# Altium footprint library PassiveComponents.PcbLib: 48 footprints (part 3 of 3)
Each footprint in its own frame and in the unit in brackets; x right, y up, seen from the top. Pads: shape width x height; smd on the part's side, far side on the other; paste and mask are expansions set on the pad; w line width, h text height; cw(c..) or ccw(c..) is an arc to the next point about the centre after c.
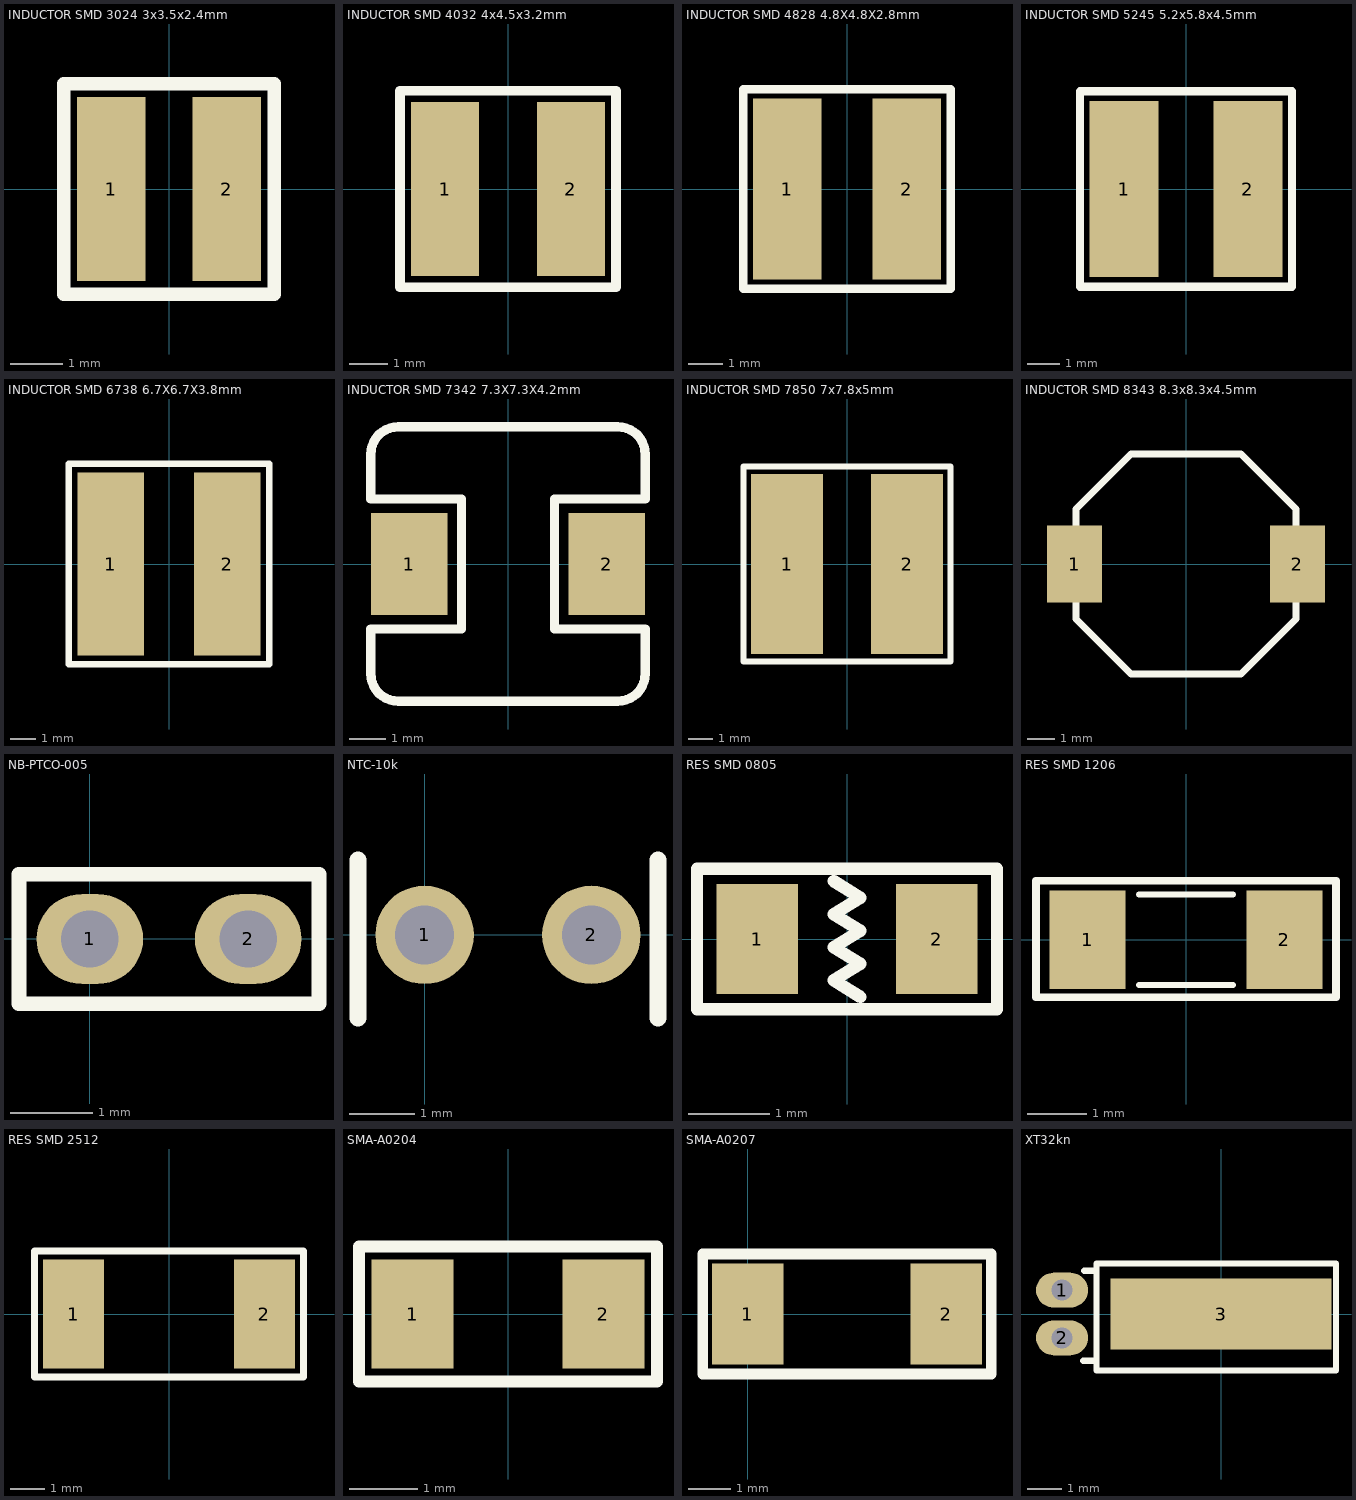
[diagram p2: the footprints below, top view; thin cyan lines are the x and y axes]

## INDUCTOR SMD 3024 3x3.5x2.4mm [mm] "Inductor CD43 Body 3x3.5x2.4mm, Pad 3.5x1.3mm"
height 2.4
pads (2):
  rect 1.3x3.5 smd: 1(-1.1,0) 2(1.1,0)
Top Overlay:
  lines w0.254: -2,-2 2,-2 2,2 -2,2 -2,-2
3D body "User Library-SDR0302.STEP": height 3, standoff 0, extent -1.5,-1.488 1.5,1.488

## INDUCTOR SMD 4032 4x4.5x3.2mm [mm] "Inductor 4032 Body 4x4.5x3.2mm, Pad 4.5X1.75mm"
height 3.2
pads (2):
  rect 1.75x4.5 smd: 1(-1.625,0) 2(1.625,0)
Top Overlay:
  lines w0.254: -2.794,-2.54 -2.794,2.54 2.794,2.54 2.794,-2.54 -2.794,-2.54
3D body "User Library-4532-1.STEP": height 3.18, standoff -0.07, extent -2.244,-2.057 2.245,1.943

## INDUCTOR SMD 4828 4.8X4.8X2.8mm [mm] "Inductor 4D28 Body 4.8X4.8X2.8mm, Pad 5.3x2mm"
height 2.8
pads (2):
  rect 2x5.3 smd: 1(-1.75,0) 2(1.75,0)
Top Overlay:
  lines w0.254: -3.048,-2.921 -3.048,2.921 3.048,2.921 3.048,-2.921 -3.048,-2.921
3D body "Coilcraft-MSS6132-DEFAULT.STEP": height 3, standoff -0.2, extent -2.994,-2.982 3,2.982

## INDUCTOR SMD 5245 5.2x5.8x4.5mm [mm] "Inductor 5245 Body 5.2x5.8x4.5mm, Pad 5.5x2.15mm"
height 4.5
pads (2):
  rect 2.15x5.5 smd: 1(-1.925,0) 2(1.925,0)
Top Overlay:
  lines w0.254: -3.302,-3.048 -3.302,3.048 3.302,3.048 3.302,-3.048 -3.302,-3.048
3D body "User Library-5845.STEP": height 4.5, standoff -0.05, extent -2.893,-2.592 2.893,2.592

## INDUCTOR SMD 6738 6.7X6.7X3.8mm [mm] "Inductor 6D38 Body 6.7X6.7X3.8mmmm, Pad 7.3x2.65mm"
height 3.8
pads (2):
  rect 2.65x7.3 smd: 1(-2.325,0) 2(2.325,0)
Top Overlay:
  lines w0.254: -4,-4 4,-4 4,4 -4,4 -4,-4
3D body "Coilcraft-MSS7341T.STEP": height 4.1, standoff 0, extent -3.78,-3.751 3.78,3.78

## INDUCTOR SMD 7342 7.3X7.3X4.2mm [mm] "Inductor 7342 Body 7.3x7.3X4.2mm, Pad 2.8x2.1mm"
height 4.2
pads (2):
  rect 2.1x2.8 smd: 1(-2.7,0) 2(2.7,0)
Top Overlay:
  lines w0.254: -3.75,-3 ccw(c-3,-3) -3,-3.75 3,-3.75 ccw(c3,-3) 3.75,-3 3.75,-1.778 1.27,-1.778 1.27,1.778 3.75,1.778 3.75,3 ccw(c3,3) 3,3.75 -3,3.75 ccw(c-3,3) -3.75,3 -3.75,1.778 -1.27,1.778 -1.27,-1.778 -3.75,-1.778 -3.75,-3
3D body "User Library-WE-DD-M.STEP": height 4.8, standoff 0, extent -3.65,-3.65 3.65,3.65

## INDUCTOR SMD 7850 7x7.8x5mm [mm] "Inductor 7850 Body 7x7.8x5mm, Pad 5.5x2.15mm"
height 4.5
pads (2):
  rect 3x7.5 smd: 1(-2.5,0) 2(2.5,0)
Top Overlay:
  lines w0.254: -4.318,-4.064 4.318,-4.064 4.318,4.064 -4.318,4.064 -4.318,-4.064
3D body "User Library-7850-1.STEP": height 5, standoff -0.05, extent -3.896,-3.486 3.896,3.514

## INDUCTOR SMD 8343 8.3x8.3x4.5mm [mm] "Inductor 8D43 Body 8.3x8.3x4.5mm, Pad 2x2.8mm"
height 4.5
pads (2):
  rect 2x2.8 smd: 1(-4.05,0) 2(4.05,0)
Top Overlay:
  lines w0.254: -4,-2 -4,2 -2,4 2,4 4,2 4,-2 2,-4 -2,-4 -4,-2

## NB-PTCO-005 [mm] "PT100"
pads (2):
  oval 1.3x1.1 hole 0.7: 1(0,0) 2(1.93,0)
Top Overlay:
  lines w0.178: -0.864,-0.787 2.794,-0.787 2.794,0.787 -0.864,0.787 -0.864,-0.787
3D body "c-nb-ptco-005-1-3d.stp": height 4.3, standoff -8, extent -0.035,-0.457 1.965,0.543

## NTC-10k [mm]
pads (2):
  round 1.5 hole 0.9: 1(0,0) 2(2.54,0)
Top Overlay:
  lines w0.254: -1.016,-1.27 -1.016,1.143 ; 3.556,-1.27 3.556,1.143
3D body "Vishay Intertechnology-NTCLE203E3103SB0 10k.STEP": height 8, standoff -39, extent -0.821,-1.968 3.361,2.032

## RES SMD 0805 [mm]
pads (2):
  rect 1x1.35 smd: 1(-1.1,0) 2(1.1,0)
Top Overlay:
  lines w0.152: -0.165,0.711 0.165,0.508 -0.165,0.305 0.165,0.102 -0.165,-0.102 0.165,-0.305 -0.165,-0.508 0.165,-0.711 ; -1.84,-0.864 -1.84,0.864 1.84,0.864 1.84,-0.864 -1.84,-0.864
3D body "User Library-res0805-1.STEP": height 0.5, standoff 0, extent -1,-0.625 1,0.625

## RES SMD 1206 [mil]
pads (2):
  rect 50x65 smd: 1(-65,0) 2(65,0)
Top Overlay:
  lines w4: -31,-30 31,-30 ; -31,30 31,30
  lines w5: -99,-38 99,-38 99,39 -99,39 -99,-38
3D body "1206 SMD Resistor.step": height 40.05, standoff 0.6, extent -62.99,-31.49 63,31.51

## RES SMD 2512 [mm]
pads (2):
  rect 1.8x3.2 smd: 1(-2.8,0) 2(2.8,0)
Top Overlay:
  lines w0.203: -3.95,-1.854 3.95,-1.854 3.95,1.854 -3.95,1.854 -3.95,-1.854
3D body "User Library-2512 SMD Resistor.STEP": height 1.6, standoff 0, extent -3.149,-1.5 3.2,1.5

## SMA-A0204 [mm]
pads (2):
  rect 1.2x1.6 smd: 1(-1.4,0) 2(1.4,0)
Top Overlay:
  lines w0.178: -2.184,-0.991 2.184,-0.991 2.184,0.991 -2.184,0.991 -2.184,-0.991
3D body "c-9-2176315-8-ba-3d.stp": height 0.7, standoff -0.7, extent -1.75,-0.7 1.75,0.7

## SMA-A0207 [mm]
pads (2):
  rect 1.7x2.4 smd: 1(0,0) 2(4.7,0)
Top Overlay:
  lines w0.254: -1.067,-1.422 -1.067,1.422 5.766,1.422 5.766,-1.422 -1.067,-1.422
3D body "c-2176316-3-ba-3d.stp": height 2.2, standoff 0, extent -0.639,-1.1 5.261,1.1

## XT32kn [mm] "Crystal for 32,768kHz, 2pin"
height 3.81
pads (3):
  oval 1.5x1 hole 0.6: 1(-4.572,0.686) 2(-4.572,-0.686)
  rect 6.35x2.032 smd: 3(0,0)
Top Overlay:
  lines w0.178: -3.962,-1.346 -3.581,-1.346 ; -3.937,1.245 -3.581,1.245 ; -3.581,1.245 -3.581,1.448 3.302,1.448 3.302,-1.626 -3.581,-1.626 -3.581,1.245
3D body "User Library-DT-26-1.step": height 2, standoff -2, extent -4.713,-0.984 2.427,1.016